# Altium footprint library Components.PcbLib: 134 footprints (part 3 of 9)
Each footprint in its own frame and in the unit in brackets; x right, y up, seen from the top. Pads: shape width x height; smd on the part's side, far side on the other; paste and mask are expansions set on the pad; w line width, h text height; cw(c..) or ccw(c..) is an arc to the next point about the centre after c.
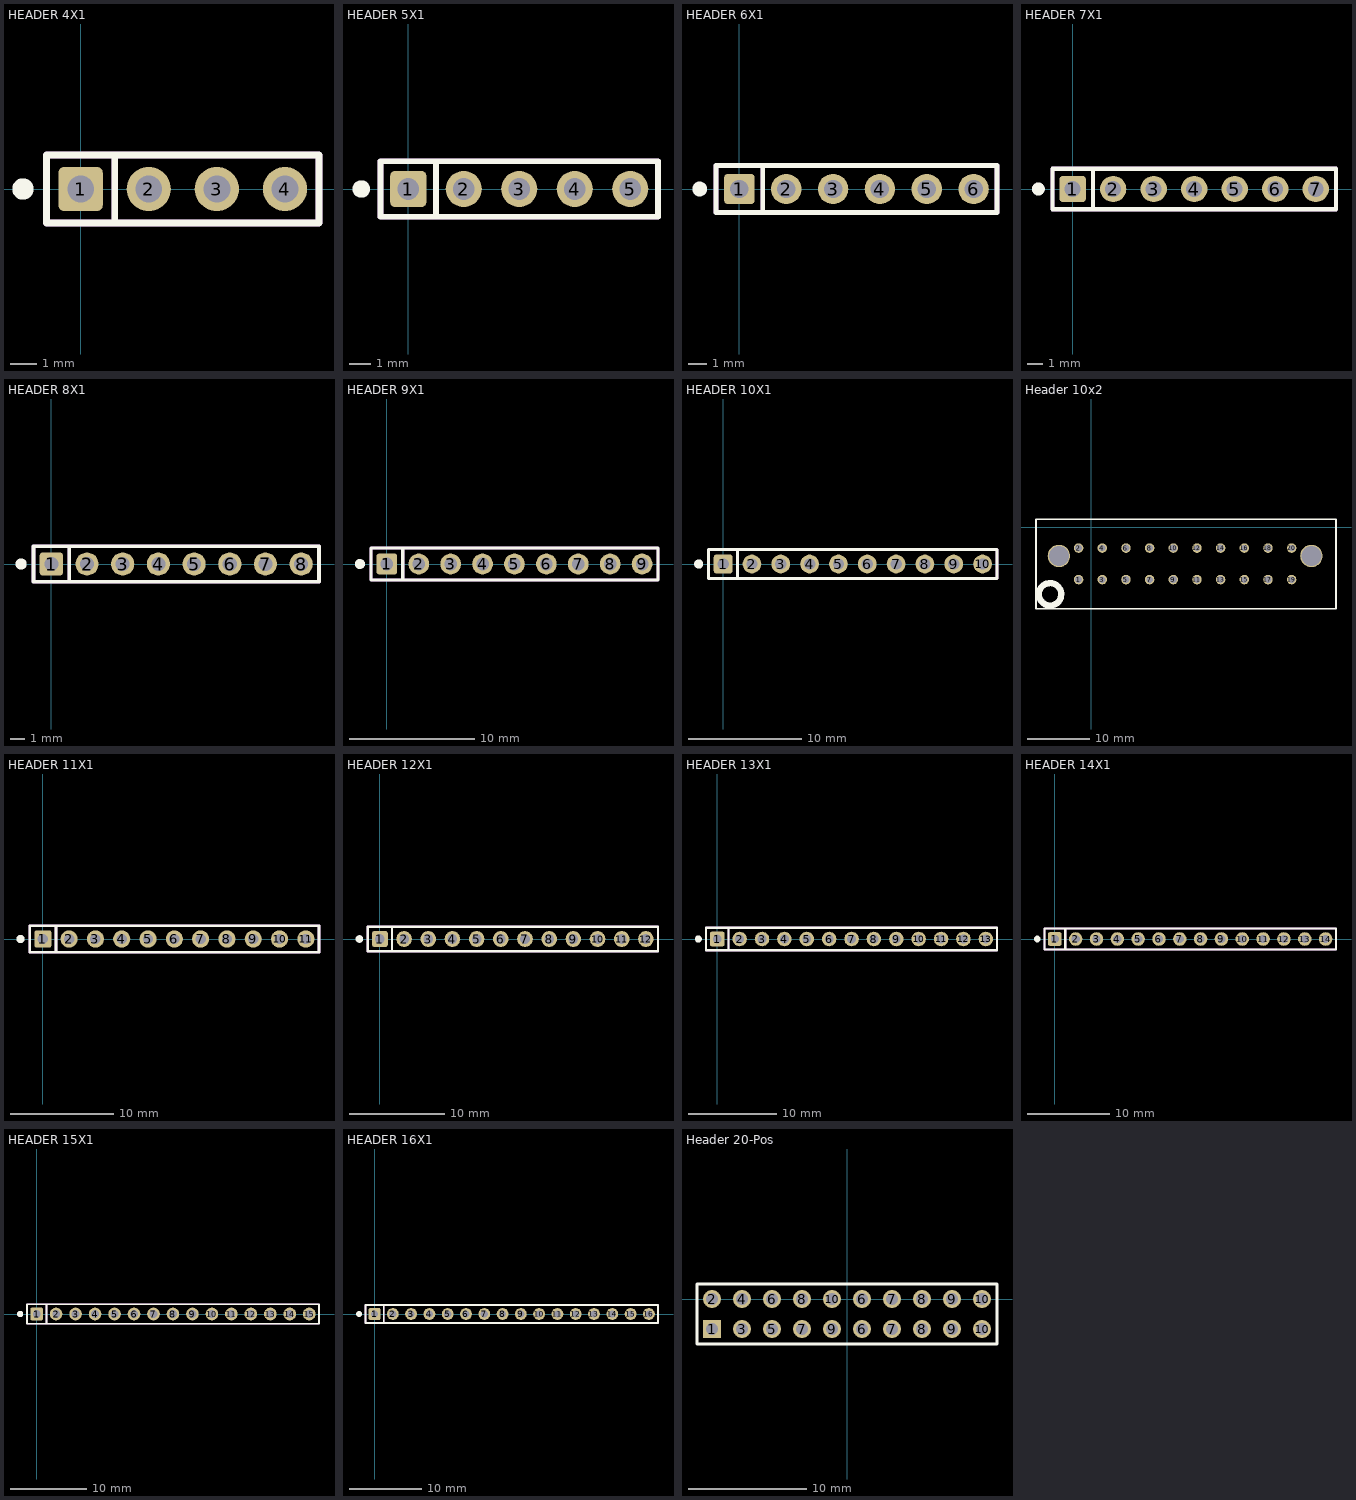
[diagram p2: the footprints below, top view; thin cyan lines are the x and y axes]

## HEADER 4X1 [mil] "PinHeader 1x4 TH Pitch 2.54mm"
height 374.02
pads (4):
  rrect25% 65x65 hole 39.37: 1(0,0)
  round 65 hole 39.37: 2(100,0) 3(200,0) 4(300,0)
Top Overlay:
  circle w19.68: c-84.65,0 r5.91
  lines w10: 50,-50 50,50 -50,50 ; -50,50 350,50 350,-50 -50,-50 -50,50
Mechanical 3:
  lines w10: 50,-50 50,50 -50,50 ; -50,50 350,50 350,-50 -50,-50 -50,50
3D body "Pin Header 1x4 TH Pitch 2.54mm.stp": height 373.85, standoff -125.98, extent -50,-50 350,50

## HEADER 5X1 [mil] "PinHeader 1x5 TH Pitch 2.54mm"
height 374.02
pads (5):
  rrect25% 65x65 hole 39.37: 1(0,0)
  round 65 hole 39.37: 2(100,0) 3(200,0) 4(300,0) 5(400,0)
Top Overlay:
  circle w19.68: c-84.65,0 r5.91
  lines w10: 50,-50 50,50 -50,50 ; -50,50 450,50 450,-50 -50,-50 -50,50
Mechanical 3:
  lines w10: 50,-50 50,50 -50,50 ; -50,50 450,50 450,-50 -50,-50 -50,50
3D body "Pin Header 1x5 TH Pitch 2.54mm.stp": height 373.85, standoff -125.98, extent -50,-50 450,50

## HEADER 6X1 [mil] "PinHeader 1x6 TH Pitch 2.54mm"
height 374.02
pads (6):
  rrect25% 65x65 hole 39.37: 1(0,0)
  round 65 hole 39.37: 2(100,0) 3(200,0) 4(300,0) 5(400,0) 6(500,0)
Top Overlay:
  circle w19.68: c-84.65,0 r5.91
  lines w10: 50,-50 50,50 -50,50 ; -50,50 -50,-50 550,-50 550,50 -50,50
Mechanical 3:
  lines w10: 50,-50 50,50 -50,50 ; -50,50 -50,-50 550,-50 550,50 -50,50
3D body "Pin Header 1x6 TH Pitch 2.54mm.stp": height 373.85, standoff -125.98, extent -50,-50 550,50

## HEADER 7X1 [mil] "PinHeader 1x7 TH Pitch 2.54mm"
height 374.02
pads (7):
  rrect25% 65x65 hole 39.37: 1(0,0)
  round 65 hole 39.37: 2(100,0) 3(200,0) 4(300,0) 5(400,0) 6(500,0) 7(600,0)
Top Overlay:
  circle w19.68: c-84.65,0 r5.91
  lines w10: 50,-50 50,50 -50,50 ; -50,50 -50,-50 650,-50 650,50 -50,50
Mechanical 3:
  lines w10: 50,-50 50,50 -50,50 ; -50,50 -50,-50 650,-50 650,50 -50,50
3D body "Pin Header 1x7 TH Pitch 2.54mm.stp": height 373.85, standoff -125.98, extent -50,-50 650,50

## HEADER 8X1 [mil] "PinHeader 1x8 TH Pitch 2.54mm"
height 374.02
pads (8):
  rrect25% 65x65 hole 39.37: 1(0,0)
  round 65 hole 39.37: 2(100,0) 3(200,0) 4(300,0) 5(400,0) 6(500,0) 7(600,0) 8(700,0)
Top Overlay:
  circle w19.68: c-84.65,0 r5.91
  lines w10: 50,-50 50,50 -50,50 ; -50,50 750,50 750,-50 -50,-50 -50,50
Mechanical 3:
  lines w10: 50,-50 50,50 -50,50 ; -50,50 750,50 750,-50 -50,-50 -50,50
3D body "Pin Header 1x8 TH Pitch 2.54mm.stp": height 373.85, standoff -125.98, extent -50,-50 750,50

## HEADER 9X1 [mil] "PinHeader 1x9 TH Pitch 2.54mm"
height 374.02
pads (9):
  rrect25% 65x65 hole 39.37: 1(0,0)
  round 65 hole 39.37: 2(100,0) 3(200,0) 4(300,0) 5(400,0) 6(500,0) 7(600,0) 8(700,0) 9(800,0)
Top Overlay:
  circle w19.68: c-84.65,0 r5.91
  lines w10: 50,-50 50,50 -50,50 ; -50,50 -50,-50 850,-50 850,50 -50,50
Mechanical 3:
  lines w10: 50,-50 50,50 -50,50 ; -50,50 -50,-50 850,-50 850,50 -50,50
3D body "Pin Header 1x9 TH Pitch 2.54mm.stp": height 373.85, standoff -125.98, extent -50,-50 850,50

## HEADER 10X1 [mil] "PinHeader 1x10 TH Pitch 2.54mm"
height 374.02
pads (10):
  rrect25% 65x65 hole 39.37: 1(0,0)
  round 65 hole 39.37: 2(100,0) 3(200,0) 4(300,0) 5(400,0) 6(500,0) 7(600,0) 8(700,0) 9(800,0) 10(900,0)
Top Overlay:
  circle w19.68: c-84.65,0 r5.91
  lines w10: 50,-50 50,50 -50,50 ; -50,50 950,50 950,-50 -50,-50 -50,50
Mechanical 3:
  lines w10: 50,-50 50,50 -50,50 ; -50,50 950,50 950,-50 -50,-50 -50,50
3D body "Pin Header 1x10 TH Pitch 2.54mm.stp": height 373.85, standoff -125.98, extent -50,-50 950,50

## Header 10x2 [mil]
pads (22):
  round 60 hole 45.28: 1(-81,-333) 2(-81,-133) 5(219,-333) 6(219,-133) 9(519,-333) 10(519,-133) 13(819,-333) 14(819,-133) 17(1119,-333) 18(1119,-133)
  round 60 hole 40: 3(69,-333) 4(69,-133) 7(369,-333) 8(369,-133) 11(669,-333) 12(669,-133) 15(969,-333) 16(969,-133) 19(1269,-333) 20(1269,-133)
  round 141.73 hole 125.98: ""(-206,-183) ""(1394,-183)
Top Overlay:
  lines w10: 348,50 -351,50 -351,-518 1550,-518 1550,50 350,50
  lines w39.37: -191.01,-427.25 cw(c-261.87,-426) -191,-426

## HEADER 11X1 [mil] "PinHeader 1x11 TH Pitch 2.54mm"
height 374.02
pads (11):
  rrect25% 65x65 hole 39.37: 1(0,0)
  round 65 hole 39.37: 2(100,0) 3(200,0) 4(300,0) 5(400,0) 6(500,0) 7(600,0) 8(700,0) 9(800,0) 10(900,0) 11(1000,0)
Top Overlay:
  circle w19.68: c-84.65,0 r5.91
  lines w10: 50,-50 50,50 -50,50 ; -50,50 -50,-50 1050,-50 1050,50 -50,50
Mechanical 3:
  lines w10: 50,-50 50,50 -50,50 ; -50,50 -50,-50 1050,-50 1050,50 -50,50
3D body "Pin Header 1x11 TH Pitch 2.54mm.stp": height 373.85, standoff -125.98, extent -50,-50 1050,50

## HEADER 12X1 [mil] "PinHeader 1x12 TH Pitch 2.54mm"
height 374.02
pads (12):
  rrect25% 65x65 hole 39.37: 1(0,0)
  round 65 hole 39.37: 2(100,0) 3(200,0) 4(300,0) 5(400,0) 6(500,0) 7(600,0) 8(700,0) 9(800,0) 10(900,0) 11(1000,0) 12(1100,0)
Top Overlay:
  circle w19.68: c-84.65,0 r5.91
  lines w10: 50,-50 50,50 -50,50 ; -50,50 -50,-50 1150,-50 1150,50 -50,50
Mechanical 3:
  lines w10: 50,-50 50,50 -50,50 ; -50,50 -50,-50 1150,-50 1150,50 -50,50
3D body "Pin Header 1x12 TH Pitch 2.54mm.stp": height 373.85, standoff -125.98, extent -50,-50 1150,50

## HEADER 13X1 [mil] "PinHeader 1x13 TH Pitch 2.54mm"
height 374.02
pads (13):
  rrect25% 65x65 hole 39.37: 1(0,0)
  round 65 hole 39.37: 2(100,0) 3(200,0) 4(300,0) 5(400,0) 6(500,0) 7(600,0) 8(700,0) 9(800,0) 10(900,0) 11(1000,0) 12(1100,0) 13(1200,0)
Top Overlay:
  circle w19.68: c-84.65,0 r5.91
  lines w10: 50,-50 50,50 -50,50 ; -50,50 -50,-50 1250,-50 1250,50 -50,50
Mechanical 3:
  lines w10: 50,-50 50,50 -50,50 ; -50,50 -50,-50 1250,-50 1250,50 -50,50
3D body "Pin Header 1x13 TH Pitch 2.54mm.stp": height 373.85, standoff -125.98, extent -50,-50 1250,50

## HEADER 14X1 [mil] "PinHeader 1x14 TH Pitch 2.54mm"
height 374.02
pads (14):
  rrect25% 65x65 hole 39.37: 1(0,0)
  round 65 hole 39.37: 2(100,0) 3(200,0) 4(300,0) 5(400,0) 6(500,0) 7(600,0) 8(700,0) 9(800,0) 10(900,0) 11(1000,0) 12(1100,0) 13(1200,0) 14(1300,0)
Top Overlay:
  circle w19.68: c-84.65,0 r5.91
  lines w10: 50,-50 50,50 -50,50 ; -50,50 -50,-50 1350,-50 1350,50 -50,50
Mechanical 3:
  lines w10: 50,-50 50,50 -50,50 ; -50,50 -50,-50 1350,-50 1350,50 -50,50
3D body "Pin Header 1x14 TH Pitch 2.54mm.stp": height 373.85, standoff -125.98, extent -50,-50 1350,50

## HEADER 15X1 [mil] "PinHeader 1x15 TH Pitch 2.54mm"
height 374.02
pads (15):
  rrect25% 65x65 hole 39.37: 1(0,0)
  round 65 hole 39.37: 2(100,0) 3(200,0) 4(300,0) 5(400,0) 6(500,0) 7(600,0) 8(700,0) 9(800,0) 10(900,0) 11(1000,0) 12(1100,0) 13(1200,0) 14(1300,0) 15(1400,0)
Top Overlay:
  circle w19.68: c-84.65,0 r5.91
  lines w10: 50,-50 50,50 -50,50 ; -50,50 1450,50 1450,-50 -50,-50 -50,50
Mechanical 3:
  lines w10: 50,-50 50,50 -50,50 ; -50,50 1450,50 1450,-50 -50,-50 -50,50
3D body "Pin Header 1x15 TH Pitch 2.54mm.stp": height 373.85, standoff -125.98, extent -50,-50 1450,50

## HEADER 16X1 [mil] "PinHeader 1x16 TH Pitch 2.54mm"
height 374.02
pads (16):
  rrect25% 65x65 hole 39.37: 1(0,0)
  round 65 hole 39.37: 2(100,0) 3(200,0) 4(300,0) 5(400,0) 6(500,0) 7(600,0) 8(700,0) 9(800,0) 10(900,0) 11(1000,0) 12(1100,0) 13(1200,0) 14(1300,0) 15(1400,0) 16(1500,0)
Top Overlay:
  circle w19.68: c-84.65,0 r5.91
  lines w10: 50,-50 50,50 -50,50 ; -50,50 -50,-50 1550,-50 1550,50 -50,50
Mechanical 3:
  lines w10: 50,-50 50,50 -50,50 ; -50,50 -50,-50 1550,-50 1550,50 -50,50
3D body "Pin Header 1x16 TH Pitch 2.54mm.stp": height 373.85, standoff -125.98, extent -50,-50 1550,50

## Header 20-Pos [mil]
pads (20):
  rect 60x60 hole 40: 1(-450,-100)
  round 60 hole 40: 2(-450,0) 3(-350,-100) 4(-350,0) 5(-250,-100) 6(-250,0) 6(50,-100) 6(50,0) 7(-150,-100) 7(150,-100) 7(150,0) 8(-150,0) 8(250,-100) 8(250,0) 9(-50,-100) 9(350,-100) 9(350,0) 10(-50,0) 10(450,-100) 10(450,0)
Top Overlay:
  lines w10: -500,-150 500,-150 500,50 -500,50 -500,-150

## HEATSINK TO220 [mm]
height 12.7
via 0,13.335 diameter 4.318 hole 3.81
3D body "TO-220 heatsink with screw.step": height 13.04, standoff -3.61, extent -6.502,0.05 6.498,19.05